# Altium footprint library MYLIB.PcbLib: 600 footprints (part 17 of 39)
Each footprint in its own frame and in the unit in brackets; x right, y up, seen from the top. Pads: shape width x height; smd on the part's side, far side on the other; paste and mask are expansions set on the pad; w line width, h text height; cw(c..) or ccw(c..) is an arc to the next point about the centre after c.
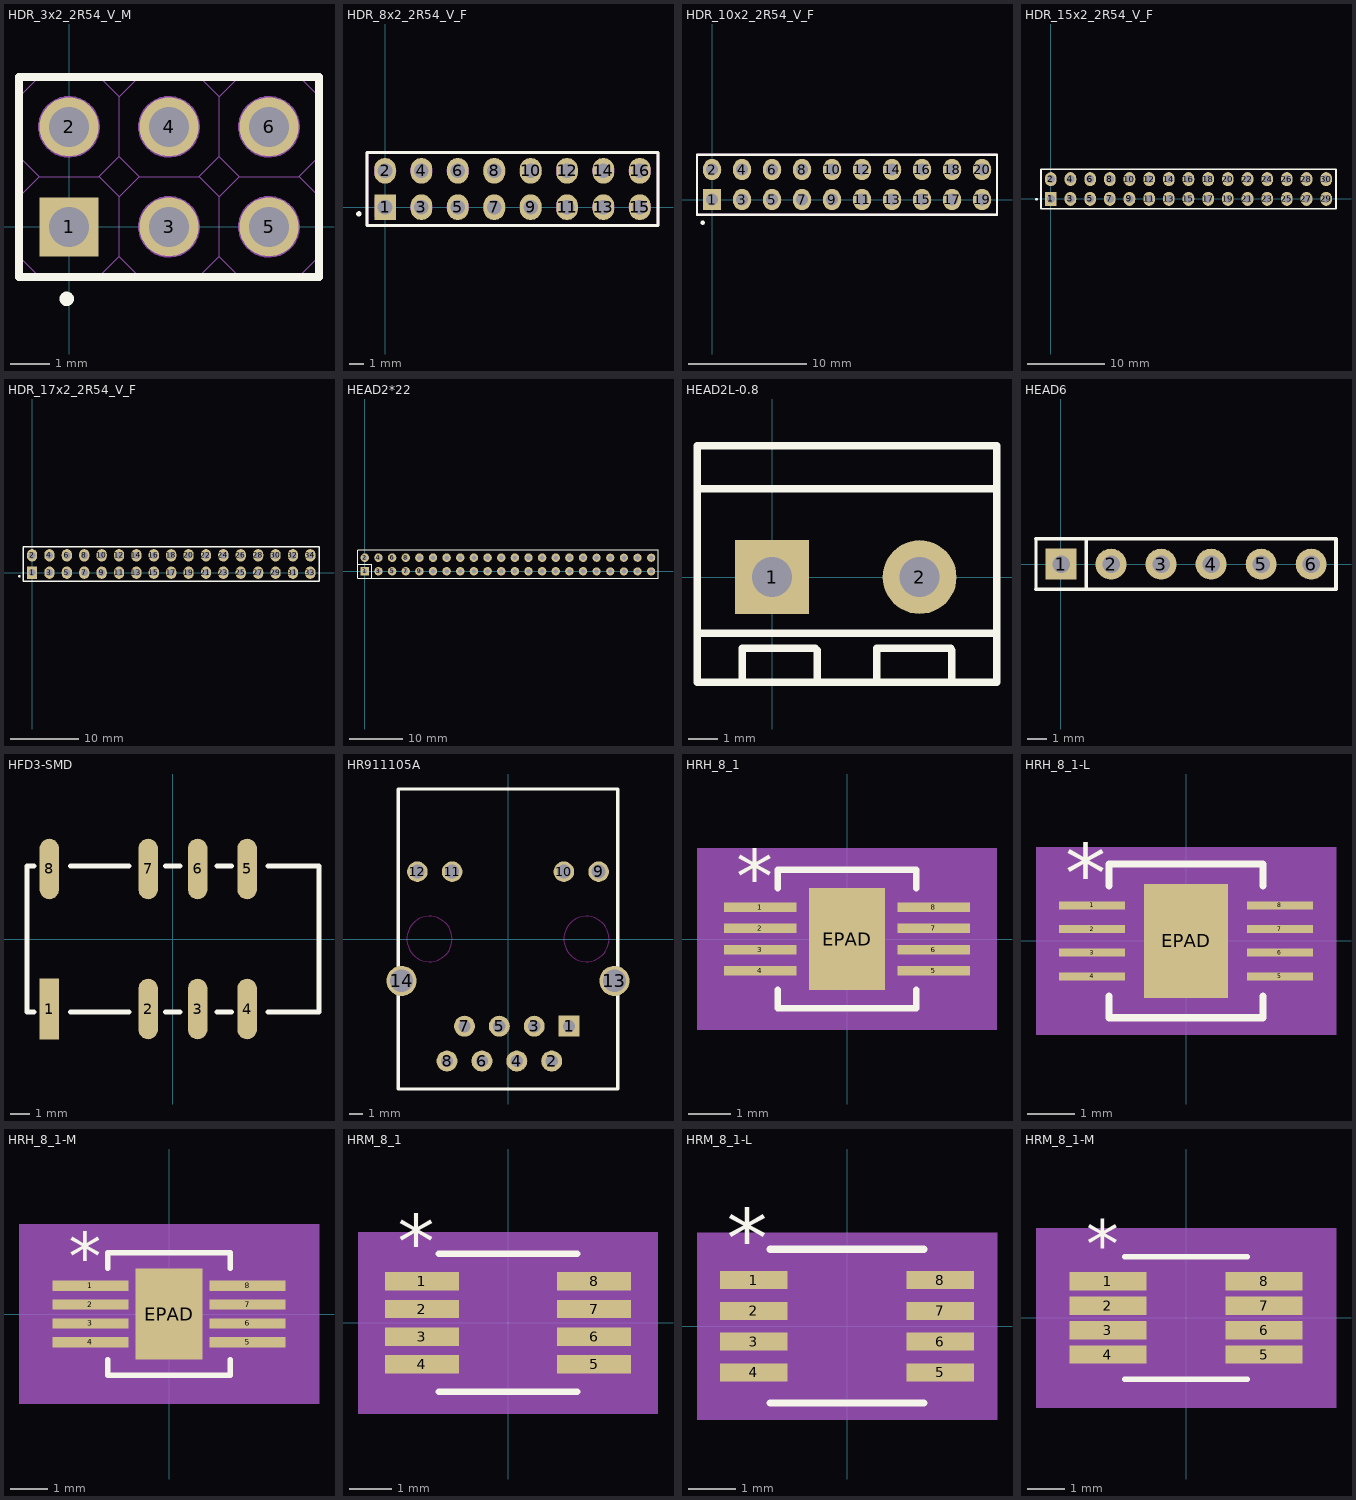
[diagram p16: the footprints below, top view; thin cyan lines are the x and y axes]

## HDR_3x2_2R54_V_M [mm] "Male Header, Pitch 2.54mm, 2x3 Position, Mated Height 6mm, Tail Length 3mm"
height 6
pads (6):
  rect 1.5x1.5 hole 1.02: 1(0,0)
  round 1.5 hole 1.02: 2(0,2.54) 3(2.54,0) 4(2.54,2.54) 5(5.08,0) 6(5.08,2.54)
Top Overlay:
  circle w0.25: c-0.059,-1.829 r0.059
  lines w0.2: -1.27,-1.27 -1.27,3.81 6.35,3.81 6.35,-1.27 -1.27,-1.27
Mechanical 7:
  circle w0.2: c2.54,0 r0.684
  circle w0.2: c5.08,0 r0.684
  circle w0.2: c5.08,2.54 r0.684
  circle w0.2: c2.54,2.54 r0.684
  circle w0.2: c0,2.54 r0.684
  lines w0.2: -1.27,-1.27 -1.27,3.81 6.35,3.81 6.35,-1.27 -1.27,-1.27 ; -0.635,-0.635 -0.635,0.635 0.635,0.635 0.635,-0.635 -0.635,-0.635
Mechanical 13:
  lines w0.025: 6.35,-0.762 5.842,-1.27 ; 6.35,0.762 5.842,1.27 ; 6.35,1.778 5.842,1.27 ; 6.35,3.302 5.842,3.81 4.318,3.81 3.81,3.302 ; -1.27,-0.762 -1.27,0.762 ; -1.27,-0.762 -1.27,0.762 ; -1.27,-0.762 -0.762,-1.27 ; -1.27,0.762 -0.762,1.27 ; -1.27,1.778 -0.762,1.27 ; -1.27,1.778 -1.27,3.302 ; -1.27,1.778 -1.27,3.302 ; -1.27,3.302 -0.762,3.81 0.762,3.81 1.27,3.302 ; -0.762,-1.27 0.762,-1.27 ; -0.762,-1.27 0.762,-1.27 ; -0.762,1.27 0.762,1.27 ; -0.762,1.27 0.762,1.27 ; -0.762,1.27 0.762,1.27 ; 0.762,-1.27 1.27,-0.762 ; 0.762,1.27 1.27,0.762 ; 0.762,1.27 1.27,1.778 ; 1.27,-0.762 1.27,0.762 ; 1.27,-0.762 1.27,0.762 ; 1.27,-0.762 1.27,0.762 ; 1.27,-0.762 1.27,0.762 ; 1.27,-0.762 1.778,-1.27 ; 1.27,0.762 1.778,1.27 ; 1.27,1.778 1.778,1.27 ; 1.27,1.778 1.27,3.302 ; 1.27,1.778 1.27,3.302 ; 1.27,1.778 1.27,3.302 ; 1.27,1.778 1.27,3.302 ; 1.27,3.302 1.778,3.81 3.302,3.81 3.81,3.302 ; 1.778,-1.27 3.302,-1.27 ; 1.778,-1.27 3.302,-1.27 ; 1.778,1.27 3.302,1.27 ; 1.778,1.27 3.302,1.27 ; 1.778,1.27 3.302,1.27 ; 3.302,-1.27 3.81,-0.762 ; 3.302,1.27 3.81,0.762 ; 3.302,1.27 3.81,1.778 ; 3.81,-0.762 3.81,0.762 ; 3.81,-0.762 3.81,0.762 ; 3.81,-0.762 3.81,0.762 ; 3.81,-0.762 3.81,0.762 ; 3.81,-0.762 4.318,-1.27 ; 3.81,0.762 4.318,1.27 ; 3.81,1.778 4.318,1.27 ; 3.81,1.778 3.81,3.302 ; 3.81,1.778 3.81,3.302 ; 3.81,1.778 3.81,3.302 ; 3.81,1.778 3.81,3.302 ; 4.318,-1.27 5.842,-1.27 ; 4.318,-1.27 5.842,-1.27 ; 4.318,1.27 5.842,1.27 ; 4.318,1.27 5.842,1.27 ; 4.318,1.27 5.842,1.27
3D body: height 2.54, standoff 0, extent -1.27,-1.27 1.27,1.27
3D body: height 2.54, standoff 0, extent 1.27,-1.27 3.81,1.27
3D body: height 2.54, standoff 0, extent 3.81,-1.27 6.35,1.27
3D body: height 2.54, standoff 0, extent 3.81,1.27 6.35,3.81
3D body: height 2.54, standoff 0, extent 1.27,1.27 3.81,3.81
3D body: height 2.54, standoff 0, extent -1.27,1.27 1.27,3.81
3D body: height 9, standoff -2.54, extent -0.349,-0.349 0.349,0.349
3D body: height 9, standoff -2.54, extent 2.191,-0.349 2.889,0.349
3D body: height 9, standoff -2.54, extent 4.731,-0.349 5.429,0.349
3D body: height 9, standoff -2.54, extent -0.349,2.191 0.349,2.889
3D body: height 9, standoff -2.54, extent 2.191,2.191 2.889,2.889
3D body: height 9, standoff -2.54, extent 4.731,2.191 5.429,2.889

## HDR_8x2_2R54_V_F [mm] "Female Header, Pitch 2.54mm, 2x8 Position, Mated Height 6mm, Tail Length 3mm"
height 6
pads (16):
  rect 1.5x1.8 hole 1.02: 1(0,0)
  oval 1.5x1.8 hole 1.02: 2(0,2.54) 3(2.54,0) 4(2.54,2.54) 5(5.08,0) 6(5.08,2.54) 7(7.62,0) 8(7.62,2.54) 9(10.16,0) 10(10.16,2.54) 11(12.7,0) 12(12.7,2.54) 13(15.24,0) 14(15.24,2.54) 15(17.78,0) 16(17.78,2.54)
Top Overlay:
  circle w0.25: c-1.829,-0.465 r0.059
  lines w0.2: -1.27,-1.27 19.05,-1.27 19.05,3.81 -1.27,3.81 -1.27,-1.27
Mechanical 7:
  circle w0.2: c0,2.54 r0.684
  circle w0.2: c2.54,2.54 r0.684
  circle w0.2: c5.08,2.54 r0.684
  circle w0.2: c7.62,2.54 r0.684
  circle w0.2: c10.16,2.54 r0.684
  circle w0.2: c12.7,2.54 r0.684
  circle w0.2: c12.7,0 r0.684
  circle w0.2: c10.16,0 r0.684
  circle w0.2: c7.62,0 r0.684
  circle w0.2: c5.08,0 r0.684
  circle w0.2: c2.54,0 r0.684
  circle w0.2: c15.24,0 r0.684
  circle w0.2: c17.78,0 r0.684
  circle w0.2: c17.78,2.54 r0.684
  circle w0.2: c15.24,2.54 r0.684
  lines w0.2: -1.27,-1.27 19.05,-1.27 19.05,3.81 -1.27,3.81 -1.27,-1.27 ; -0.635,-0.635 0.635,-0.635 0.635,0.635 -0.635,0.635 -0.635,-0.635
3D body: height 2.54, standoff -10, extent -0.349,-0.349 0.349,0.349
3D body: height 8.64, standoff 0, extent -1.268,-1.27 1.272,1.27
3D body: height 2.54, standoff -10, extent -0.349,2.191 0.349,2.889
3D body: height 8.64, standoff 0, extent -1.268,1.27 1.272,3.81
3D body: height 2.54, standoff -10, extent 2.191,2.191 2.889,2.889
3D body: height 8.64, standoff 0, extent 1.272,1.27 3.812,3.81
3D body: height 2.54, standoff -10, extent 2.191,-0.349 2.889,0.349
3D body: height 8.64, standoff 0, extent 1.272,-1.27 3.812,1.27
3D body: height 2.54, standoff -10, extent 4.731,2.191 5.429,2.889
3D body: height 8.64, standoff 0, extent 3.812,1.27 6.352,3.81
3D body: height 2.54, standoff -10, extent 4.731,-0.349 5.429,0.349
3D body: height 8.64, standoff 0, extent 3.812,-1.27 6.352,1.27
3D body: height 2.54, standoff -10, extent 7.271,2.191 7.969,2.889
3D body: height 8.64, standoff 0, extent 6.352,1.27 8.892,3.81
3D body: height 2.54, standoff -10, extent 7.271,-0.349 7.969,0.349
3D body: height 8.64, standoff 0, extent 6.352,-1.27 8.892,1.27
3D body: height 2.54, standoff -10, extent 9.811,-0.349 10.509,0.349
3D body: height 8.64, standoff 0, extent 8.892,-1.27 11.432,1.27
3D body: height 2.54, standoff -10, extent 9.811,2.191 10.509,2.889
3D body: height 8.64, standoff 0, extent 8.892,1.27 11.432,3.81
3D body: height 2.54, standoff -10, extent 12.351,2.191 13.049,2.889
3D body: height 8.64, standoff 0, extent 11.432,1.27 13.972,3.81
3D body: height 2.54, standoff -10, extent 12.351,-0.349 13.049,0.349
3D body: height 8.64, standoff 0, extent 11.432,-1.27 13.972,1.27
3D body: height 8.64, standoff 0, extent 16.512,-1.27 19.052,1.27
3D body: height 2.54, standoff -10, extent 17.431,-0.349 18.129,0.349
3D body: height 8.64, standoff 0, extent 16.512,1.27 19.052,3.81
3D body: height 2.54, standoff -10, extent 17.431,2.191 18.129,2.889
3D body: height 8.64, standoff 0, extent 13.972,1.27 16.512,3.81
3D body: height 2.54, standoff -10, extent 14.891,2.191 15.589,2.889
3D body: height 8.64, standoff 0, extent 13.972,-1.27 16.512,1.27
3D body: height 2.54, standoff -10, extent 14.891,-0.349 15.589,0.349

## HDR_10x2_2R54_V_F [mm] "Female Header, Pitch 2.54mm, 2x8 Position, Mated Height 6mm, Tail Length 3mm"
height 6
pads (20):
  rect 1.5x1.8 hole 1.02: 1(0,0)
  oval 1.5x1.8 hole 1.02: 2(0,2.54) 3(2.54,0) 4(2.54,2.54) 5(5.08,0) 6(5.08,2.54) 7(7.62,0) 8(7.62,2.54) 9(10.16,0) 10(10.16,2.54) 11(12.7,0) 12(12.7,2.54) 13(15.24,0) 14(15.24,2.54) 15(17.78,0) 16(17.78,2.54) 17(20.32,0) 18(20.32,2.54) 19(22.86,0) 20(22.86,2.54)
Top Overlay:
  circle w0.25: c-0.787,-1.96 r0.059
  lines w0.2: -1.27,-1.27 -1.27,3.81 24.13,3.81 24.13,-1.27 -1.27,-1.27
Mechanical 7:
  circle w0.2: c20.32,0 r0.684
  circle w0.2: c20.32,2.54 r0.684
  circle w0.2: c15.24,2.54 r0.684
  circle w0.2: c17.78,2.54 r0.684
  circle w0.2: c17.78,0 r0.684
  circle w0.2: c15.24,0 r0.684
  circle w0.2: c2.54,0 r0.684
  circle w0.2: c5.08,0 r0.684
  circle w0.2: c7.62,0 r0.684
  circle w0.2: c10.16,0 r0.684
  circle w0.2: c12.7,0 r0.684
  circle w0.2: c12.7,2.54 r0.684
  circle w0.2: c10.16,2.54 r0.684
  circle w0.2: c7.62,2.54 r0.684
  circle w0.2: c5.08,2.54 r0.684
  circle w0.2: c2.54,2.54 r0.684
  circle w0.2: c0,2.54 r0.684
  circle w0.2: c22.86,2.54 r0.684
  circle w0.2: c22.86,0 r0.684
  lines w0.2: -1.27,-1.27 -1.27,3.81 24.13,3.81 24.13,-1.27 -1.27,-1.27 ; -0.635,-0.635 -0.635,0.635 0.635,0.635 0.635,-0.635 -0.635,-0.635
3D body: height 8.64, standoff 0, extent 19.052,-1.27 21.592,1.27
3D body: height 2.54, standoff -10, extent 19.971,-0.349 20.669,0.349
3D body: height 8.64, standoff 0, extent 19.052,1.27 21.592,3.81
3D body: height 2.54, standoff -10, extent 19.971,2.191 20.669,2.889
3D body: height 2.54, standoff -10, extent 14.891,-0.349 15.589,0.349
3D body: height 8.64, standoff 0, extent 13.972,-1.27 16.512,1.27
3D body: height 2.54, standoff -10, extent 14.891,2.191 15.589,2.889
3D body: height 8.64, standoff 0, extent 13.972,1.27 16.512,3.81
3D body: height 2.54, standoff -10, extent 17.431,2.191 18.129,2.889
3D body: height 8.64, standoff 0, extent 16.512,1.27 19.052,3.81
3D body: height 2.54, standoff -10, extent 17.431,-0.349 18.129,0.349
3D body: height 8.64, standoff 0, extent 16.512,-1.27 19.052,1.27
3D body: height 8.64, standoff 0, extent 11.432,-1.27 13.972,1.27
3D body: height 2.54, standoff -10, extent 12.351,-0.349 13.049,0.349
3D body: height 8.64, standoff 0, extent 11.432,1.27 13.972,3.81
3D body: height 2.54, standoff -10, extent 12.351,2.191 13.049,2.889
3D body: height 8.64, standoff 0, extent 8.892,1.27 11.432,3.81
3D body: height 2.54, standoff -10, extent 9.811,2.191 10.509,2.889
3D body: height 8.64, standoff 0, extent 8.892,-1.27 11.432,1.27
3D body: height 2.54, standoff -10, extent 9.811,-0.349 10.509,0.349
3D body: height 8.64, standoff 0, extent 6.352,-1.27 8.892,1.27
3D body: height 2.54, standoff -10, extent 7.271,-0.349 7.969,0.349
3D body: height 8.64, standoff 0, extent 6.352,1.27 8.892,3.81
3D body: height 2.54, standoff -10, extent 7.271,2.191 7.969,2.889
3D body: height 8.64, standoff 0, extent 3.812,-1.27 6.352,1.27
3D body: height 2.54, standoff -10, extent 4.731,-0.349 5.429,0.349
3D body: height 8.64, standoff 0, extent 3.812,1.27 6.352,3.81
3D body: height 2.54, standoff -10, extent 4.731,2.191 5.429,2.889
3D body: height 8.64, standoff 0, extent 1.272,-1.27 3.812,1.27
3D body: height 2.54, standoff -10, extent 2.191,-0.349 2.889,0.349
3D body: height 8.64, standoff 0, extent 1.272,1.27 3.812,3.81
3D body: height 2.54, standoff -10, extent 2.191,2.191 2.889,2.889
3D body: height 8.64, standoff 0, extent -1.268,1.27 1.272,3.81
3D body: height 2.54, standoff -10, extent -0.349,2.191 0.349,2.889
3D body: height 8.64, standoff 0, extent -1.268,-1.27 1.272,1.27
3D body: height 2.54, standoff -10, extent -0.349,-0.349 0.349,0.349
3D body: height 2.54, standoff -10, extent 22.511,2.191 23.209,2.889
3D body: height 8.64, standoff 0, extent 21.592,1.27 24.132,3.81
3D body: height 2.54, standoff -10, extent 22.511,-0.349 23.209,0.349
3D body: height 8.64, standoff 0, extent 21.592,-1.27 24.132,1.27

## HDR_15x2_2R54_V_F [mm] "Female Header, Pitch 2.54mm, 2x15 Position, Mated Height 6mm, Tail Length 3mm"
height 6
pads (30):
  rect 1.5x1.8 hole 1.02: 1(0,0)
  oval 1.5x1.8 hole 1.02: 2(0,2.54) 3(2.54,0) 4(2.54,2.54) 5(5.08,0) 6(5.08,2.54) 7(7.62,0) 8(7.62,2.54) 9(10.16,0) 10(10.16,2.54) 11(12.7,0) 12(12.7,2.54) 13(15.24,0) 14(15.24,2.54) 15(17.78,0) 16(17.78,2.54) 17(20.32,0) 18(20.32,2.54) 19(22.86,0) 20(22.86,2.54) 21(25.4,0) 22(25.4,2.54) 23(27.94,0) 24(27.94,2.54) 25(30.48,0) 26(30.48,2.54) 27(33.02,0) 28(33.02,2.54) 29(35.56,0) 30(35.56,2.54)
Top Overlay:
  circle w0.25: c-1.854,-0.059 r0.059
  lines w0.2: -1.27,-1.27 -1.27,3.81 36.83,3.81 36.83,-1.27 -1.27,-1.27
3D body: height 8.64, standoff 0, extent 34.292,-1.27 36.832,1.27
3D body: height 2.54, standoff -10, extent 35.211,-0.349 35.909,0.349
3D body: height 8.64, standoff 0, extent 34.292,1.27 36.832,3.81
3D body: height 2.54, standoff -10, extent 35.211,2.191 35.909,2.889
3D body: height 2.54, standoff -10, extent 25.051,2.191 25.749,2.889
3D body: height 8.64, standoff 0, extent 24.132,1.27 26.672,3.81
3D body: height 2.54, standoff -10, extent 25.051,-0.349 25.749,0.349
3D body: height 8.64, standoff 0, extent 24.132,-1.27 26.672,1.27
3D body: height 8.64, standoff 0, extent 29.212,-1.27 31.752,1.27
3D body: height 2.54, standoff -10, extent 30.131,-0.349 30.829,0.349
3D body: height 8.64, standoff 0, extent 29.212,1.27 31.752,3.81
3D body: height 2.54, standoff -10, extent 30.131,2.191 30.829,2.889
3D body: height 8.64, standoff 0, extent 26.672,1.27 29.212,3.81
3D body: height 2.54, standoff -10, extent 27.591,2.191 28.289,2.889
3D body: height 8.64, standoff 0, extent 26.672,-1.27 29.212,1.27
3D body: height 2.54, standoff -10, extent 27.591,-0.349 28.289,0.349
3D body: height 2.54, standoff -10, extent 32.671,2.191 33.369,2.889
3D body: height 8.64, standoff 0, extent 31.752,1.27 34.292,3.81
3D body: height 2.54, standoff -10, extent 32.671,-0.349 33.369,0.349
3D body: height 8.64, standoff 0, extent 31.752,-1.27 34.292,1.27
3D body: height 8.64, standoff 0, extent 19.052,-1.27 21.592,1.27
3D body: height 2.54, standoff -10, extent 19.971,-0.349 20.669,0.349
3D body: height 8.64, standoff 0, extent 19.052,1.27 21.592,3.81
3D body: height 2.54, standoff -10, extent 19.971,2.191 20.669,2.889
3D body: height 2.54, standoff -10, extent 14.891,-0.349 15.589,0.349
3D body: height 8.64, standoff 0, extent 13.972,-1.27 16.512,1.27
3D body: height 2.54, standoff -10, extent 14.891,2.191 15.589,2.889
3D body: height 8.64, standoff 0, extent 13.972,1.27 16.512,3.81
3D body: height 2.54, standoff -10, extent 17.431,2.191 18.129,2.889
3D body: height 8.64, standoff 0, extent 16.512,1.27 19.052,3.81
3D body: height 2.54, standoff -10, extent 17.431,-0.349 18.129,0.349
3D body: height 8.64, standoff 0, extent 16.512,-1.27 19.052,1.27
3D body: height 8.64, standoff 0, extent 11.432,-1.27 13.972,1.27
3D body: height 2.54, standoff -10, extent 12.351,-0.349 13.049,0.349
3D body: height 8.64, standoff 0, extent 11.432,1.27 13.972,3.81
3D body: height 2.54, standoff -10, extent 12.351,2.191 13.049,2.889
3D body: height 8.64, standoff 0, extent 8.892,1.27 11.432,3.81
3D body: height 2.54, standoff -10, extent 9.811,2.191 10.509,2.889
3D body: height 8.64, standoff 0, extent 8.892,-1.27 11.432,1.27
3D body: height 2.54, standoff -10, extent 9.811,-0.349 10.509,0.349
3D body: height 8.64, standoff 0, extent 6.352,-1.27 8.892,1.27
3D body: height 2.54, standoff -10, extent 7.271,-0.349 7.969,0.349
3D body: height 8.64, standoff 0, extent 6.352,1.27 8.892,3.81
3D body: height 2.54, standoff -10, extent 7.271,2.191 7.969,2.889
3D body: height 8.64, standoff 0, extent 3.812,-1.27 6.352,1.27
3D body: height 2.54, standoff -10, extent 4.731,-0.349 5.429,0.349
3D body: height 8.64, standoff 0, extent 3.812,1.27 6.352,3.81
3D body: height 2.54, standoff -10, extent 4.731,2.191 5.429,2.889
3D body: height 8.64, standoff 0, extent 1.272,-1.27 3.812,1.27
3D body: height 2.54, standoff -10, extent 2.191,-0.349 2.889,0.349
3D body: height 8.64, standoff 0, extent 1.272,1.27 3.812,3.81
3D body: height 2.54, standoff -10, extent 2.191,2.191 2.889,2.889
3D body: height 8.64, standoff 0, extent -1.268,1.27 1.272,3.81
3D body: height 2.54, standoff -10, extent -0.349,2.191 0.349,2.889
3D body: height 8.64, standoff 0, extent -1.268,-1.27 1.272,1.27
3D body: height 2.54, standoff -10, extent -0.349,-0.349 0.349,0.349
3D body: height 2.54, standoff -10, extent 22.511,2.191 23.209,2.889
3D body: height 8.64, standoff 0, extent 21.592,1.27 24.132,3.81
3D body: height 2.54, standoff -10, extent 22.511,-0.349 23.209,0.349
3D body: height 8.64, standoff 0, extent 21.592,-1.27 24.132,1.27

## HDR_17x2_2R54_V_F [mm] "Female Header, Pitch 2.54mm, 2x17 Position, Mated Height 6mm, Tail Length 3mm"
height 6
pads (34):
  rect 1.5x1.8 hole 1.02: 1(0,0)
  oval 1.5x1.8 hole 1.02: 2(0,2.54) 3(2.54,0) 4(2.54,2.54) 5(5.08,0) 6(5.08,2.54) 7(7.62,0) 8(7.62,2.54) 9(10.16,0) 10(10.16,2.54) 11(12.7,0) 12(12.7,2.54) 13(15.24,0) 14(15.24,2.54) 15(17.78,0) 16(17.78,2.54) 17(20.32,0) 18(20.32,2.54) 19(22.86,0) 20(22.86,2.54) 21(25.4,0) 22(25.4,2.54) 23(27.94,0) 24(27.94,2.54) 25(30.48,0) 26(30.48,2.54) 27(33.02,0) 28(33.02,2.54) 29(35.56,0) 30(35.56,2.54) 31(38.1,0) 32(38.1,2.54) 33(40.64,0) 34(40.64,2.54)
Top Overlay:
  circle w0.25: c-1.854,-0.516 r0.059
  lines w0.2: -1.27,-1.27 -1.27,3.81 41.91,3.81 41.91,-1.27 -1.27,-1.27
3D body: height 8.64, standoff 0, extent 34.292,-1.27 36.832,1.27
3D body: height 2.54, standoff -10, extent 35.211,-0.349 35.909,0.349
3D body: height 8.64, standoff 0, extent 34.292,1.27 36.832,3.81
3D body: height 2.54, standoff -10, extent 35.211,2.191 35.909,2.889
3D body: height 2.54, standoff -10, extent 25.051,2.191 25.749,2.889
3D body: height 8.64, standoff 0, extent 24.132,1.27 26.672,3.81
3D body: height 2.54, standoff -10, extent 25.051,-0.349 25.749,0.349
3D body: height 8.64, standoff 0, extent 24.132,-1.27 26.672,1.27
3D body: height 8.64, standoff 0, extent 29.212,-1.27 31.752,1.27
3D body: height 2.54, standoff -10, extent 30.131,-0.349 30.829,0.349
3D body: height 8.64, standoff 0, extent 29.212,1.27 31.752,3.81
3D body: height 2.54, standoff -10, extent 30.131,2.191 30.829,2.889
3D body: height 8.64, standoff 0, extent 26.672,1.27 29.212,3.81
3D body: height 2.54, standoff -10, extent 27.591,2.191 28.289,2.889
3D body: height 8.64, standoff 0, extent 26.672,-1.27 29.212,1.27
3D body: height 2.54, standoff -10, extent 27.591,-0.349 28.289,0.349
3D body: height 2.54, standoff -10, extent 32.671,2.191 33.369,2.889
3D body: height 8.64, standoff 0, extent 31.752,1.27 34.292,3.81
3D body: height 2.54, standoff -10, extent 32.671,-0.349 33.369,0.349
3D body: height 8.64, standoff 0, extent 31.752,-1.27 34.292,1.27
3D body: height 8.64, standoff 0, extent 19.052,-1.27 21.592,1.27
3D body: height 2.54, standoff -10, extent 19.971,-0.349 20.669,0.349
3D body: height 8.64, standoff 0, extent 19.052,1.27 21.592,3.81
3D body: height 2.54, standoff -10, extent 19.971,2.191 20.669,2.889
3D body: height 2.54, standoff -10, extent 14.891,-0.349 15.589,0.349
3D body: height 8.64, standoff 0, extent 13.972,-1.27 16.512,1.27
3D body: height 2.54, standoff -10, extent 14.891,2.191 15.589,2.889
3D body: height 8.64, standoff 0, extent 13.972,1.27 16.512,3.81
3D body: height 2.54, standoff -10, extent 17.431,2.191 18.129,2.889
3D body: height 8.64, standoff 0, extent 16.512,1.27 19.052,3.81
3D body: height 2.54, standoff -10, extent 17.431,-0.349 18.129,0.349
3D body: height 8.64, standoff 0, extent 16.512,-1.27 19.052,1.27
3D body: height 8.64, standoff 0, extent 11.432,-1.27 13.972,1.27
3D body: height 2.54, standoff -10, extent 12.351,-0.349 13.049,0.349
3D body: height 8.64, standoff 0, extent 11.432,1.27 13.972,3.81
3D body: height 2.54, standoff -10, extent 12.351,2.191 13.049,2.889
3D body: height 8.64, standoff 0, extent 8.892,1.27 11.432,3.81
3D body: height 2.54, standoff -10, extent 9.811,2.191 10.509,2.889
3D body: height 8.64, standoff 0, extent 8.892,-1.27 11.432,1.27
3D body: height 2.54, standoff -10, extent 9.811,-0.349 10.509,0.349
3D body: height 8.64, standoff 0, extent 6.352,-1.27 8.892,1.27
3D body: height 2.54, standoff -10, extent 7.271,-0.349 7.969,0.349
3D body: height 8.64, standoff 0, extent 6.352,1.27 8.892,3.81
3D body: height 2.54, standoff -10, extent 7.271,2.191 7.969,2.889
3D body: height 8.64, standoff 0, extent 3.812,-1.27 6.352,1.27
3D body: height 2.54, standoff -10, extent 4.731,-0.349 5.429,0.349
3D body: height 8.64, standoff 0, extent 3.812,1.27 6.352,3.81
3D body: height 2.54, standoff -10, extent 4.731,2.191 5.429,2.889
3D body: height 8.64, standoff 0, extent 1.272,-1.27 3.812,1.27
3D body: height 2.54, standoff -10, extent 2.191,-0.349 2.889,0.349
3D body: height 8.64, standoff 0, extent 1.272,1.27 3.812,3.81
3D body: height 2.54, standoff -10, extent 2.191,2.191 2.889,2.889
3D body: height 8.64, standoff 0, extent -1.268,1.27 1.272,3.81
3D body: height 2.54, standoff -10, extent -0.349,2.191 0.349,2.889
3D body: height 8.64, standoff 0, extent -1.268,-1.27 1.272,1.27
3D body: height 2.54, standoff -10, extent -0.349,-0.349 0.349,0.349
3D body: height 2.54, standoff -10, extent 22.511,2.191 23.209,2.889
3D body: height 8.64, standoff 0, extent 21.592,1.27 24.132,3.81
3D body: height 2.54, standoff -10, extent 22.511,-0.349 23.209,0.349
3D body: height 8.64, standoff 0, extent 21.592,-1.27 24.132,1.27
3D body: height 8.64, standoff 0, extent 36.832,-1.27 39.372,1.27
3D body: height 2.54, standoff -10, extent 37.751,-0.349 38.449,0.349
3D body: height 8.64, standoff 0, extent 36.832,1.27 39.372,3.81
3D body: height 2.54, standoff -10, extent 37.751,2.191 38.449,2.889
3D body: height 2.54, standoff -10, extent 40.291,2.191 40.989,2.889
3D body: height 8.64, standoff 0, extent 39.372,1.27 41.912,3.81
3D body: height 2.54, standoff -10, extent 40.291,-0.349 40.989,0.349
3D body: height 8.64, standoff 0, extent 39.372,-1.27 41.912,1.27

## HEAD2*22 [mil]
pads (44):
  rect 62x62 hole 35: 1(0.42,0.42)
  round 62 hole 35: 2(0.42,100.42) 3(100.42,0.42) 4(100.42,100.42) 5(200.43,0.42) 6(200.43,100.42) 7(300.43,0.42) 8(300.43,100.42) 9(400.43,0.42) 10(400.43,100.42) 11(500.43,0.42) 12(500.43,100.42) 13(600.42,0.42) 14(600.42,100.42) 15(700.42,0.42) 16(700.42,100.42) 17(800.42,0.42) 18(800.42,100.42) 19(900.42,0.42) 20(900.42,100.42) 21(1000.42,0.42) 22(1000.42,100.42) 23(1100.42,0.42) 24(1100.42,100.42) 25(1200.42,0.42) 26(1200.42,100.42) 27(1300.42,0.42) 28(1300.42,100.42) 29(1400.42,0.42) 30(1400.42,100.42) 31(1500.42,0.42) 32(1500.42,100.42) 33(1600.42,0.42) 34(1600.42,100.42)
  round 60 hole 35: 35(1700,0) 36(1700,100) 37(1800,0) 38(1800,100) 39(1900,0) 40(1900,100) 41(2000,0) 42(2000,100) 43(2100,0) 44(2100,100)
Top Overlay:
  lines w7: -49.58,51.18 51.18,51.18 51.18,-49.58 ; -49.58,-49.58 -49.58,150.43 -49.58,155.87 -47.97,157.48 2150,157.48 2150,-49.58 1650.42,-49.58 -49.58,-49.58

## HEAD2L-0.8 [mm]
pads (2):
  rect 2.5x2.5 hole 1.35: 1(0,0)
  round 2.5 hole 1.35: 2(5,0)
Top Overlay:
  lines w0.254: -2.54,-1.905 7.62,-1.905 ; -2.54,3 7.62,3 ; -1.016,-3.556 -1.016,-2.476 ; -1.016,-2.413 1.461,-2.413 1.524,-2.476 1.524,-3.556 ; 3.556,-3.493 3.556,-2.413 6.056,-2.413 ; 6.096,-3.556 6.096,-2.476 ; -2.54,-3.556 -2.54,4.445 7.62,4.445 7.62,-3.556 -2.54,-3.556

## HEAD6 [mil]
pads (6):
  rect 62x62 hole 35: 1(0.42,0.42)
  round 62 hole 35: 2(100.42,0.42) 3(200.43,0.42) 4(300.43,0.42) 5(400.43,0.42) 6(500.43,0.42)
Top Overlay:
  lines w6: -49.58,-49.58 -49.58,51.18
  lines w7: -49.58,-49.58 550,-49.58 550,51.18 -49.58,51.18 51.18,51.18 51.18,-49.58

## HFD3-SMD [mm] "超小型型号继电器（15mm*7.5mm*9mm)"
pads (8):
  rect 1x3.11 smd: 1(-6.35,-3.595)
  oval 1x3.11 smd: 2(-1.27,-3.595) 3(1.27,-3.595) 4(3.81,-3.595) 5(3.81,3.595) 6(1.27,3.595) 7(-1.27,3.595) 8(-6.35,3.595)
Top Overlay:
  lines w0.254: -7.125,-3.75 -7.5,-3.75 -7.5,3.75 -7.125,3.75 ; -5.25,-3.75 -2.25,-3.75 ; -5.25,3.75 -2.25,3.75 ; -0.375,-3.75 0.375,-3.75 ; -0.375,3.75 0.375,3.75 ; 2.25,-3.75 3,-3.75 ; 2.25,3.75 3,3.75 ; 4.875,-3.75 7.5,-3.75 7.5,3.75 4.875,3.75
3D body "HFD3-SMD.STEP": height 9.5, standoff 0, extent -7.5,-4.65 7.5,4.65

## HR911105A [mm]
pads (14):
  rect 1.524x1.524 hole 0.889: 1(4.45,-6.35)
  round 1.524 hole 0.889: 2(3.18,-8.89) 3(1.91,-6.35) 4(0.64,-8.89) 5(-0.63,-6.35) 6(-1.9,-8.89) 7(-3.17,-6.35) 8(-4.44,-8.89)
  round 1.5 hole 1.02: 9(6.6,4.9) 10(4.064,4.9) 11(-4.064,4.9) 12(-6.6,4.9)
  round 2.2 hole 1.65: 13(7.75,-3.048) 14(-7.75,-3.048)
Top Overlay:
  lines w0.254: -8,-10.922 -8,10.922 0,10.922 8,10.922 8,-10.922 0,-10.922 -8,-10.922
Keep-Out Layer:
  circle w0.051: c-5.714,0 r1.65
  circle w0.051: c5.716,0 r1.65

## HRH_8_1 [mm]
pads (9):
  rect 1.711x0.219 smd paste+0 mask+0: 1(-2.04,0.75) 2(-2.04,0.25) 3(-2.04,-0.25) 4(-2.04,-0.75) 5(2.04,-0.75) 6(2.04,-0.25) 7(2.04,0.25) 8(2.04,0.75)
  rect 1.78x2.41 smd paste-1.192 mask+0: EPAD(0,0)
Top Overlay:
  lines w0.152: -1.627,-1.192 -1.627,-1.627 1.627,-1.627 1.627,-1.192 ; -1.627,1.192 -1.627,1.627 1.627,1.627 1.627,1.192
  text "*" at -2.611,0.842 h1.27
Top Paste:
  region: 0.89,1.205 -0.89,1.205 -0.89,-1.205 0.89,-1.205
Mechanical 5:
  region: 3.531,-2.135 -3.531,-2.135 -3.531,2.135 3.531,2.135
Mechanical 13:
  lines w0: -0.305,1.5 ccw(c0,1.5) 0.305,1.5
  lines w0.025: -2.54,-0.885 -1.5,-0.885 -1.5,-0.615 -2.54,-0.615 -2.54,-0.885 ; -2.54,-0.385 -1.5,-0.385 -1.5,-0.115 -2.54,-0.115 -2.54,-0.385 ; -2.54,0.115 -1.5,0.115 -1.5,0.385 -2.54,0.385 -2.54,0.115 ; -2.54,0.615 -1.5,0.615 -1.5,0.885 -2.54,0.885 -2.54,0.615 ; -1.5,-1.5 -1.5,1.5 1.5,1.5 1.5,-1.5 -1.5,-1.5 ; 1.5,-0.885 2.54,-0.885 2.54,-0.615 1.5,-0.615 1.5,-0.885 ; 1.5,-0.385 2.54,-0.385 2.54,-0.115 1.5,-0.115 1.5,-0.385 ; 1.5,0.115 2.54,0.115 2.54,0.385 1.5,0.385 1.5,0.115 ; 1.5,0.615 2.54,0.615 2.54,0.885 1.5,0.885 1.5,0.615
  text "*" at -1.436,0.154 h1.27
Mechanical 15:
  region: -1.754,-1.114 -3.15,-1.114 -3.15,1.114 -1.754,1.114 -1.754,1.754 1.754,1.754 1.754,1.114 3.15,1.114 3.15,-1.114 1.754,-1.114 1.754,-1.754 -1.754,-1.754
  lines w0.152: -3.15,-1.114 -1.754,-1.114 -1.754,-1.754 1.754,-1.754 1.754,-1.114 3.15,-1.114 3.15,1.114 1.754,1.114 1.754,1.754 -1.754,1.754 -1.754,1.114 -3.15,1.114 -3.15,-1.114
3D body: height 0.25, standoff 0, extent 0,0 0.254,0.254

## HRH_8_1-L [mm]
pads (9):
  rect 1.406x0.168 smd paste+0 mask+0: 1(-1.989,0.75) 2(-1.989,0.25) 3(-1.989,-0.25) 4(-1.989,-0.75) 5(1.989,-0.75) 6(1.989,-0.25) 7(1.989,0.25) 8(1.989,0.75)
  rect 1.78x2.41 smd paste-1.192 mask+0: EPAD(0,0)
Top Overlay:
  lines w0.152: -1.627,-1.167 -1.627,-1.627 1.627,-1.627 1.627,-1.167 ; -1.627,1.167 -1.627,1.627 1.627,1.627 1.627,1.167
  text "*" at -2.561,0.791 h1.27
Top Paste:
  region: 0.89,1.205 -0.89,1.205 -0.89,-1.205 0.89,-1.205
Mechanical 5:
  region: 3.175,-1.983 -3.175,-1.983 -3.175,1.983 3.175,1.983
Mechanical 13:
  lines w0: -0.305,1.5 ccw(c0,1.5) 0.305,1.5
  lines w0.025: -2.54,-0.885 -2.54,-0.615 -1.5,-0.615 -1.5,-0.885 -2.54,-0.885 ; -2.54,-0.385 -2.54,-0.115 -1.5,-0.115 -1.5,-0.385 -2.54,-0.385 ; -2.54,0.115 -2.54,0.385 -1.5,0.385 -1.5,0.115 -2.54,0.115 ; -2.54,0.615 -2.54,0.885 -1.5,0.885 -1.5,0.615 -2.54,0.615 ; -1.5,-1.5 1.5,-1.5 1.5,1.5 -1.5,1.5 -1.5,-1.5 ; 1.5,-0.885 1.5,-0.615 2.54,-0.615 2.54,-0.885 1.5,-0.885 ; 1.5,-0.385 1.5,-0.115 2.54,-0.115 2.54,-0.385 1.5,-0.385 ; 1.5,0.115 1.5,0.385 2.54,0.385 2.54,0.115 1.5,0.115 ; 1.5,0.615 1.5,0.885 2.54,0.885 2.54,0.615 1.5,0.615
  text "*" at -1.436,0.154 h1.27
Mechanical 15:
  region: -1.602,-0.936 -2.794,-0.936 -2.794,0.936 -1.602,0.936 -1.602,1.602 1.602,1.602 1.602,0.936 2.794,0.936 2.794,-0.936 1.602,-0.936 1.602,-1.602 -1.602,-1.602
  lines w0.152: -2.794,-0.936 -2.794,0.936 -1.602,0.936 -1.602,1.602 1.602,1.602 1.602,0.936 2.794,0.936 2.794,-0.936 1.602,-0.936 1.602,-1.602 -1.602,-1.602 -1.602,-0.936 -2.794,-0.936
3D body: height 0.25, standoff 0, extent 0,0 0.254,0.254

## HRH_8_1-M [mm]
pads (9):
  rect 2.016x0.27 smd paste+0 mask+0: 1(-2.091,0.75) 2(-2.091,0.25) 3(-2.091,-0.25) 4(-2.091,-0.75) 5(2.091,-0.75) 6(2.091,-0.25) 7(2.091,0.25) 8(2.091,0.75)
  rect 1.78x2.41 smd paste-1.192 mask+0: EPAD(0,0)
Top Overlay:
  lines w0.152: -1.627,-1.218 -1.627,-1.627 1.627,-1.627 1.627,-1.218 ; -1.627,1.218 -1.627,1.627 1.627,1.627 1.627,1.218
  text "*" at -2.662,0.893 h1.27
Top Paste:
  region: 0.89,1.205 -0.89,1.205 -0.89,-1.205 0.89,-1.205
Mechanical 5:
  region: 3.988,-2.389 -3.988,-2.389 -3.988,2.389 3.988,2.389
Mechanical 13:
  lines w0: -0.305,1.5 ccw(c0,1.5) 0.305,1.5
  lines w0.025: -2.54,-0.885 -1.5,-0.885 -1.5,-0.615 -2.54,-0.615 -2.54,-0.885 ; -2.54,-0.385 -1.5,-0.385 -1.5,-0.115 -2.54,-0.115 -2.54,-0.385 ; -2.54,0.115 -1.5,0.115 -1.5,0.385 -2.54,0.385 -2.54,0.115 ; -2.54,0.615 -1.5,0.615 -1.5,0.885 -2.54,0.885 -2.54,0.615 ; -1.5,-1.5 -1.5,1.5 1.5,1.5 1.5,-1.5 -1.5,-1.5 ; 1.5,-0.885 2.54,-0.885 2.54,-0.615 1.5,-0.615 1.5,-0.885 ; 1.5,-0.385 2.54,-0.385 2.54,-0.115 1.5,-0.115 1.5,-0.385 ; 1.5,0.115 2.54,0.115 2.54,0.385 1.5,0.385 1.5,0.115 ; 1.5,0.615 2.54,0.615 2.54,0.885 1.5,0.885 1.5,0.615
  text "*" at -1.436,0.154 h1.27
Mechanical 15:
  region: -2.008,-1.393 -3.607,-1.393 -3.607,1.393 -2.008,1.393 -2.008,2.008 2.008,2.008 2.008,1.393 3.607,1.393 3.607,-1.393 2.008,-1.393 2.008,-2.008 -2.008,-2.008
  lines w0.152: -3.607,-1.393 -2.008,-1.393 -2.008,-2.008 2.008,-2.008 2.008,-1.393 3.607,-1.393 3.607,1.393 2.008,1.393 2.008,2.008 -2.008,2.008 -2.008,1.393 -3.607,1.393 -3.607,-1.393
3D body: height 0.25, standoff 0, extent 0,0 0.254,0.254

## HRM_8_1 [mil]
pads (8):
  rect 68.5x17 smd paste+0 mask+0: 1(-79.75,38.39) 2(-79.75,12.8) 3(-79.75,-12.8) 4(-79.75,-38.39) 5(79.75,-38.39) 6(79.75,-12.8) 7(79.75,12.8) 8(79.75,38.39)
Top Overlay:
  lines w6: -64.06,-64.06 64.06,-64.06 ; -64.06,64.06 64.06,64.06
  text "*" at -102.25,50.39 h50
Mechanical 5:
  region: 139,-84.06 -139,-84.06 -139,84.06 139,84.06
Mechanical 13:
  lines w0: -12,59.06 ccw(c0,59.06) 12,59.06
  lines w1: -100,-45.89 -59.06,-45.89 -59.06,-30.89 -100,-30.89 -100,-45.89 ; -100,-20.3 -59.06,-20.3 -59.06,-5.3 -100,-5.3 -100,-20.3 ; -100,5.3 -59.06,5.3 -59.06,20.3 -100,20.3 -100,5.3 ; -100,30.89 -59.06,30.89 -59.06,45.89 -100,45.89 -100,30.89 ; -59.06,-59.06 -59.06,59.06 59.06,59.06 59.06,-59.06 -59.06,-59.06 ; 59.06,-45.89 100,-45.89 100,-30.89 59.06,-30.89 59.06,-45.89 ; 59.06,-20.3 100,-20.3 100,-5.3 59.06,-5.3 59.06,-20.3 ; 59.06,5.3 100,5.3 100,20.3 59.06,20.3 59.06,5.3 ; 59.06,30.89 100,30.89 100,45.89 59.06,45.89 59.06,30.89
  text "*" at -56.56,6.06 h50
Mechanical 15:
  region: -69.06,-56.89 -124,-56.89 -124,56.89 -69.06,56.89 -69.06,69.06 69.06,69.06 69.06,56.89 124,56.89 124,-56.89 69.06,-56.89 69.06,-69.06 -69.06,-69.06
  lines w6: -124,-56.89 -69.06,-56.89 -69.06,-69.06 69.06,-69.06 69.06,-56.89 124,-56.89 124,56.89 69.06,56.89 69.06,69.06 -69.06,69.06 -69.06,56.89 -124,56.89 -124,-56.89
3D body: height 10, standoff 0, extent 0,0 10,10

## HRM_8_1-L [mil]
pads (8):
  rect 56.5x15 smd paste+0 mask+0: 1(-77.75,38.39) 2(-77.75,12.8) 3(-77.75,-12.8) 4(-77.75,-38.39) 5(77.75,-38.39) 6(77.75,-12.8) 7(77.75,12.8) 8(77.75,38.39)
Top Overlay:
  lines w6: -64.06,-64.06 64.06,-64.06 ; -64.06,64.06 64.06,64.06
  text "*" at -100.25,48.39 h50
Mechanical 5:
  region: 125,-78.06 -125,-78.06 -125,78.06 125,78.06
Mechanical 13:
  lines w0: -12,59.06 ccw(c0,59.06) 12,59.06
  lines w1: -100,-45.89 -100,-30.89 -59.06,-30.89 -59.06,-45.89 -100,-45.89 ; -100,-20.3 -100,-5.3 -59.06,-5.3 -59.06,-20.3 -100,-20.3 ; -100,5.3 -100,20.3 -59.06,20.3 -59.06,5.3 -100,5.3 ; -100,30.89 -100,45.89 -59.06,45.89 -59.06,30.89 -100,30.89 ; -59.06,-59.06 59.06,-59.06 59.06,59.06 -59.06,59.06 -59.06,-59.06 ; 59.06,-45.89 59.06,-30.89 100,-30.89 100,-45.89 59.06,-45.89 ; 59.06,-20.3 59.06,-5.3 100,-5.3 100,-20.3 59.06,-20.3 ; 59.06,5.3 59.06,20.3 100,20.3 100,5.3 59.06,5.3 ; 59.06,30.89 59.06,45.89 100,45.89 100,30.89 59.06,30.89
  text "*" at -56.56,6.06 h50
Mechanical 15:
  region: -63.06,-49.89 -110,-49.89 -110,49.89 -63.06,49.89 -63.06,63.06 63.06,63.06 63.06,49.89 110,49.89 110,-49.89 63.06,-49.89 63.06,-63.06 -63.06,-63.06
  lines w6: -110,-49.89 -110,49.89 -63.06,49.89 -63.06,63.06 63.06,63.06 63.06,49.89 110,49.89 110,-49.89 63.06,-49.89 63.06,-63.06 -63.06,-63.06 -63.06,-49.89 -110,-49.89
3D body: height 10, standoff 0, extent 0,0 10,10

## HRM_8_1-M [mil]
pads (8):
  rect 80.5x19 smd paste+0 mask+0: 1(-81.75,38.39) 2(-81.75,12.8) 3(-81.75,-12.8) 4(-81.75,-38.39) 5(81.75,-38.39) 6(81.75,-12.8) 7(81.75,12.8) 8(81.75,38.39)
Top Overlay:
  lines w6: -64.06,-64.06 64.06,-64.06 ; -64.06,64.06 64.06,64.06
  text "*" at -104.25,52.39 h50
Mechanical 5:
  region: 157,-94.06 -157,-94.06 -157,94.06 157,94.06
Mechanical 13:
  lines w0: -12,59.06 ccw(c0,59.06) 12,59.06
  lines w1: -100,-45.89 -59.06,-45.89 -59.06,-30.89 -100,-30.89 -100,-45.89 ; -100,-20.3 -59.06,-20.3 -59.06,-5.3 -100,-5.3 -100,-20.3 ; -100,5.3 -59.06,5.3 -59.06,20.3 -100,20.3 -100,5.3 ; -100,30.89 -59.06,30.89 -59.06,45.89 -100,45.89 -100,30.89 ; -59.06,-59.06 -59.06,59.06 59.06,59.06 59.06,-59.06 -59.06,-59.06 ; 59.06,-45.89 100,-45.89 100,-30.89 59.06,-30.89 59.06,-45.89 ; 59.06,-20.3 100,-20.3 100,-5.3 59.06,-5.3 59.06,-20.3 ; 59.06,5.3 100,5.3 100,20.3 59.06,20.3 59.06,5.3 ; 59.06,30.89 100,30.89 100,45.89 59.06,45.89 59.06,30.89
  text "*" at -56.56,6.06 h50
Mechanical 15:
  region: -79.06,-67.89 -142,-67.89 -142,67.89 -79.06,67.89 -79.06,79.06 79.06,79.06 79.06,67.89 142,67.89 142,-67.89 79.06,-67.89 79.06,-79.06 -79.06,-79.06
  lines w6: -142,-67.89 -79.06,-67.89 -79.06,-79.06 79.06,-79.06 79.06,-67.89 142,-67.89 142,67.89 79.06,67.89 79.06,79.06 -79.06,79.06 -79.06,67.89 -142,67.89 -142,-67.89
3D body: height 10, standoff 0, extent 0,0 10,10